# Altium footprint library mastermind.PCBLIB: 1061 footprints (part 6 of 67)
Each footprint in its own frame and in the unit in brackets; x right, y up, seen from the top. Pads: shape width x height; smd on the part's side, far side on the other; paste and mask are expansions set on the pad; w line width, h text height; cw(c..) or ccw(c..) is an arc to the next point about the centre after c.
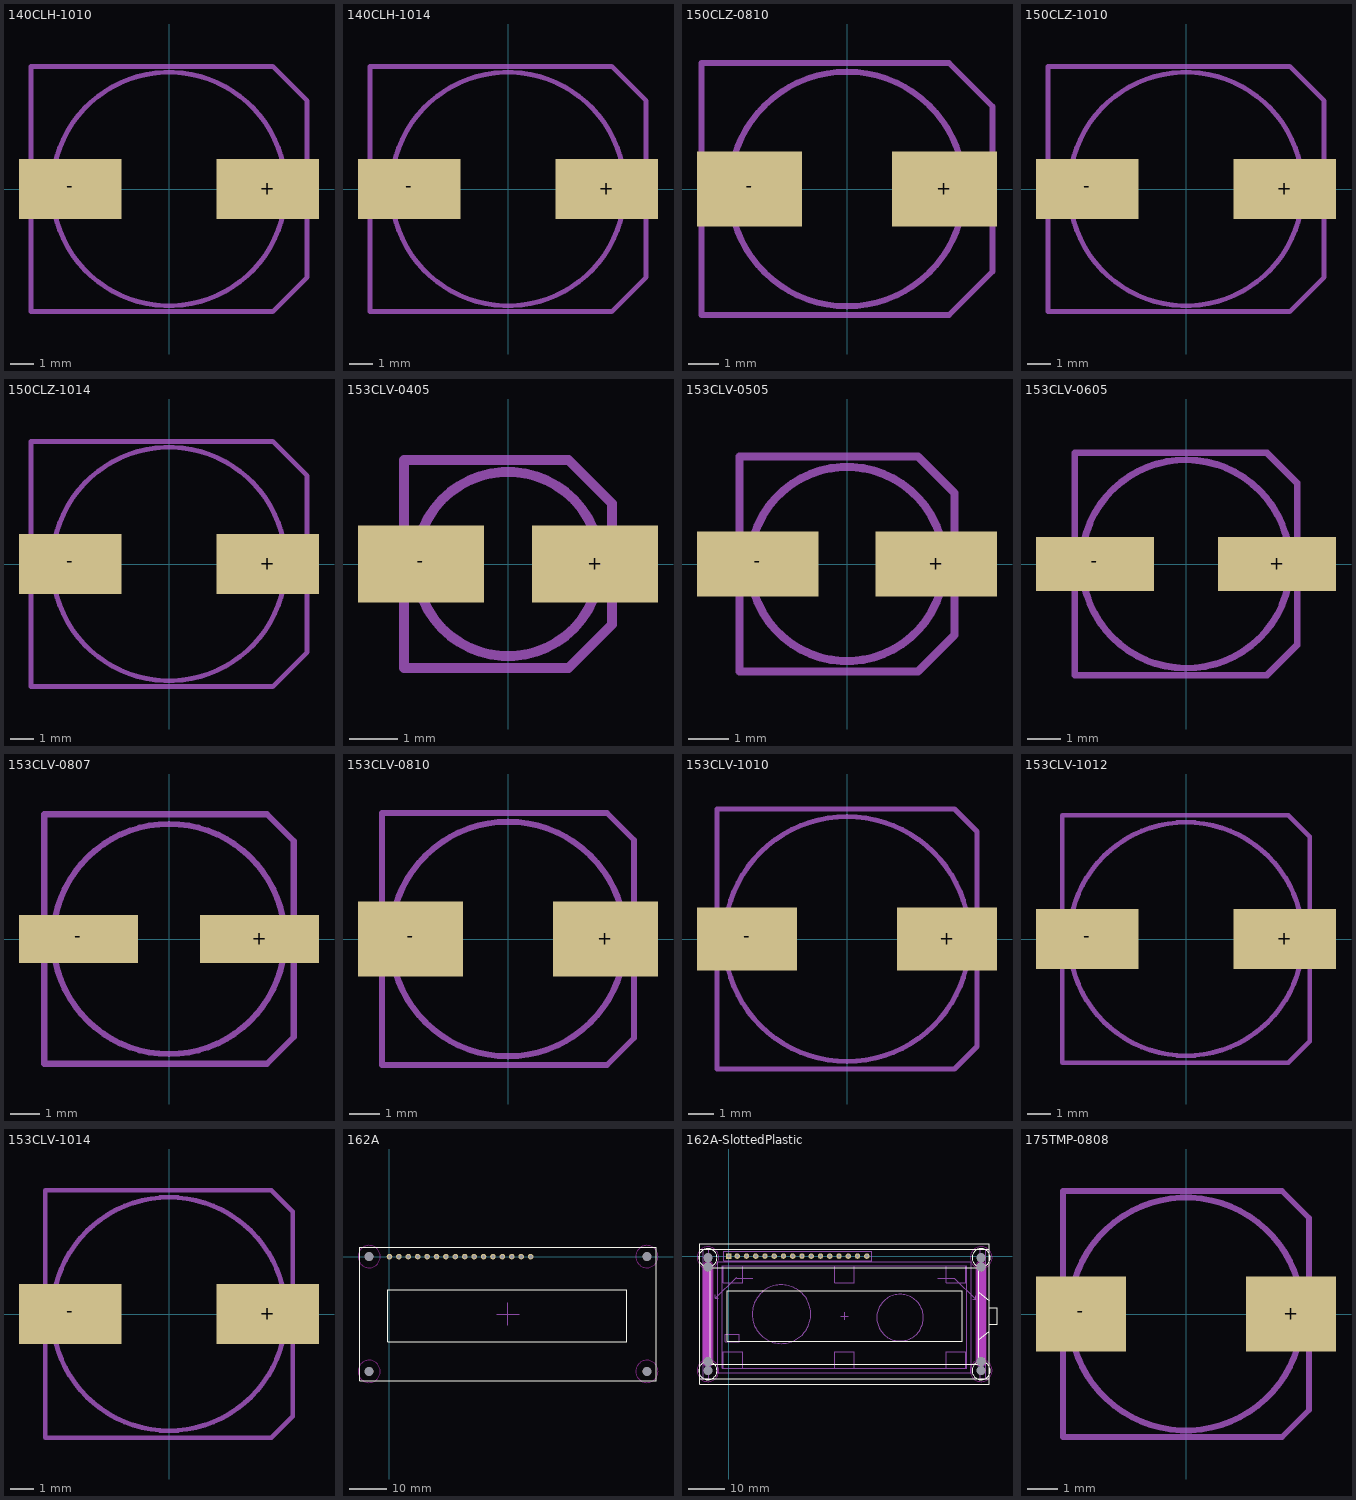
[diagram p5: the footprints below, top view; thin cyan lines are the x and y axes]

## 140CLH-1010 [mm]
pads (2):
  rect 4.3x2.5 smd: +(4.15,0) -(-4.15,0)
Mechanical 2:
  lines w0.203: -5.8,-1.45 -5.8,-5.15 4.35,-5.15 5.8,-3.7 5.8,-1.45 ; -5.8,1.45 -5.8,5.15 4.35,5.15 5.8,3.7 5.8,1.45 ; -4.7,-1.4 ccw(c0,0) 4.7,-1.4 ; -4.7,1.4 cw(c0,0) 4.7,1.4
Mechanical 8:
  lines w0.203: -5.8,-1.45 -5.8,1.45 ; -4.7,-1.4 cw(c0,0) -4.7,1.4 ; 4.7,-1.4 ccw(c0,0) 4.7,1.4 ; 5.8,-1.45 5.8,1.45

## 140CLH-1014 [mm]
pads (2):
  rect 4.3x2.5 smd: +(4.15,0) -(-4.15,0)
Mechanical 2:
  lines w0.203: -5.8,-1.45 -5.8,-5.15 4.35,-5.15 5.8,-3.7 5.8,-1.45 ; -5.8,1.45 -5.8,5.15 4.35,5.15 5.8,3.7 5.8,1.45 ; -4.7,-1.4 ccw(c0,0) 4.7,-1.4 ; -4.7,1.4 cw(c0,0) 4.7,1.4
Mechanical 8:
  lines w0.203: -5.8,-1.45 -5.8,1.45 ; -4.7,-1.4 cw(c0,0) -4.7,1.4 ; 4.7,-1.4 ccw(c0,0) 4.7,1.4 ; 5.8,-1.45 5.8,1.45

## 150CLZ-0810 [mm]
pads (2):
  rect 3.5x2.5 smd: +(3.25,0) -(-3.25,0)
Mechanical 2:
  lines w0.203: -4.85,-1.45 -4.85,-4.2 3.4,-4.2 4.85,-2.75 4.85,-1.45 ; -4.85,1.45 -4.85,4.2 3.4,4.2 4.85,2.75 4.85,1.45 ; -3.65,-1.4 ccw(c0,0) 3.65,-1.4 ; -3.65,1.4 cw(c0,0) 3.65,1.4
Mechanical 8:
  lines w0.203: -4.85,-1.45 -4.85,1.45 ; -3.65,-1.4 cw(c0,0) -3.65,1.4 ; 3.65,-1.4 ccw(c0,0) 3.65,1.4 ; 4.85,-1.45 4.85,1.45

## 150CLZ-1010 [mm]
pads (2):
  rect 4.3x2.5 smd: +(4.15,0) -(-4.15,0)
Mechanical 2:
  lines w0.203: -5.8,-1.45 -5.8,-5.15 4.35,-5.15 5.8,-3.7 5.8,-1.45 ; -5.8,1.45 -5.8,5.15 4.35,5.15 5.8,3.7 5.8,1.45 ; -4.7,-1.4 ccw(c0,0) 4.7,-1.4 ; -4.7,1.4 cw(c0,0) 4.7,1.4
Mechanical 8:
  lines w0.203: -5.8,-1.45 -5.8,1.45 ; -4.7,-1.4 cw(c0,0) -4.7,1.4 ; 4.7,-1.4 ccw(c0,0) 4.7,1.4 ; 5.8,-1.45 5.8,1.45

## 150CLZ-1014 [mm]
pads (2):
  rect 4.3x2.5 smd: +(4.15,0) -(-4.15,0)
Mechanical 2:
  lines w0.203: -5.8,-1.45 -5.8,-5.15 4.35,-5.15 5.8,-3.7 5.8,-1.45 ; -5.8,1.45 -5.8,5.15 4.35,5.15 5.8,3.7 5.8,1.45 ; -4.7,-1.4 ccw(c0,0) 4.7,-1.4 ; -4.7,1.4 cw(c0,0) 4.7,1.4
Mechanical 8:
  lines w0.203: -5.8,-1.45 -5.8,1.45 ; -4.7,-1.4 cw(c0,0) -4.7,1.4 ; 4.7,-1.4 ccw(c0,0) 4.7,1.4 ; 5.8,-1.45 5.8,1.45

## 153CLV-0405 [mm]
pads (2):
  rect 2.6x1.6 smd: +(1.8,0) -(-1.8,0)
Mechanical 2:
  lines w0.203: -2.15,-1.1 -2.15,-2.15 1.25,-2.15 2.15,-1.25 2.15,-1.05 ; -2.15,1.1 -2.15,2.15 1.25,2.15 2.15,1.25 2.15,1.1 ; -1.65,-0.95 ccw(c0,0) 1.65,-0.95 ; -1.65,0.95 cw(c0,0) 1.65,0.95
Mechanical 8:
  lines w0.203: -2.15,-1.1 -2.15,1.1 ; -1.65,-0.95 cw(c0,0) -1.65,0.95 ; 1.65,-0.95 ccw(c0,0) 1.65,0.95 ; 2.15,-1.05 2.15,1.1

## 153CLV-0505 [mm]
pads (2):
  rect 3x1.6 smd: +(2.2,0) -(-2.2,0)
Mechanical 2:
  lines w0.203: -2.65,-1.1 -2.65,-2.65 1.75,-2.65 2.65,-1.75 2.65,-1.1 ; -2.65,1.1 -2.65,2.65 1.75,2.65 2.65,1.75 2.65,1.1 ; -2.2,-0.95 ccw(c0,0) 2.2,-0.95 ; -2.2,0.95 cw(c0,0) 2.2,0.95
Mechanical 8:
  lines w0.203: -2.65,-1.1 -2.65,1.1 ; -2.2,-0.95 cw(c0,0) -2.2,0.95 ; 2.2,-0.95 ccw(c0,0) 2.2,0.95 ; 2.65,-1.1 2.65,1.1

## 153CLV-0605 [mm]
pads (2):
  rect 3.5x1.6 smd: +(2.7,0) -(-2.7,0)
Mechanical 2:
  lines w0.203: -3.3,-1.1 -3.3,-3.3 2.4,-3.3 3.3,-2.4 3.3,-1.1 ; -3.3,1.1 -3.3,3.3 2.4,3.3 3.3,2.4 3.3,1.1 ; -2.95,-0.9 ccw(c0.008,0) 2.95,-0.95 ; -2.95,0.95 cw(c-0.008,0) 2.95,0.9
Mechanical 8:
  lines w0.203: -3.3,-1.1 -3.3,1.1 ; -2.95,-0.9 cw(c0,0.025) -2.95,0.95 ; 2.95,-0.95 ccw(c0,-0.025) 2.95,0.9 ; 3.3,-1.1 3.3,1.1

## 153CLV-0807 [mm]
pads (2):
  rect 4x1.6 smd: +(3.05,0) -(-3.05,0)
Mechanical 2:
  lines w0.203: -4.2,-1.1 -4.2,-4.2 3.3,-4.2 4.2,-3.3 4.2,-1.1 ; -4.2,1.1 -4.2,4.2 3.3,4.2 4.2,3.3 4.2,1.1 ; -3.75,-1.05 ccw(c0,0.025) 3.75,-1.05 ; -3.75,1.05 cw(c0,-0.025) 3.75,1.05
Mechanical 8:
  lines w0.203: -4.2,-1.1 -4.2,1.1 ; -3.75,-1.05 cw(c0,0) -3.75,1.05 ; 3.75,-1.05 ccw(c0,0) 3.75,1.05 ; 4.2,-1.1 4.2,1.1

## 153CLV-0810 [mm]
pads (2):
  rect 3.5x2.5 smd: +(3.25,0) -(-3.25,0)
Mechanical 2:
  lines w0.203: -4.2,-1.5 -4.2,-4.2 3.3,-4.2 4.2,-3.3 4.2,-1.5 ; -4.2,1.5 -4.2,4.2 3.3,4.2 4.2,3.3 4.2,1.5 ; -3.65,-1.4 ccw(c0,0) 3.65,-1.4 ; -3.65,1.4 cw(c0,0) 3.65,1.4
Mechanical 8:
  lines w0.203: -4.2,-1.5 -4.2,1.5 ; -3.65,-1.4 cw(c0,0) -3.65,1.4 ; 3.65,-1.4 ccw(c0,0) 3.65,1.4 ; 4.2,-1.5 4.2,1.5

## 153CLV-1010 [mm]
pads (2):
  rect 4x2.5 smd: +(4,0) -(-4,0)
Mechanical 2:
  lines w0.203: -5.2,-1.5 -5.2,-5.2 4.3,-5.2 5.2,-4.3 5.2,-1.5 ; -5.2,1.5 -5.2,5.2 4.3,5.2 5.2,4.3 5.2,1.5 ; -4.65,-1.55 ccw(c0,0) 4.65,-1.55 ; -4.65,1.55 cw(c0,0) 4.65,1.55
Mechanical 8:
  lines w0.203: -5.2,-1.5 -5.2,1.5 ; -4.65,-1.55 cw(c0,0) -4.65,1.55 ; 4.65,-1.55 ccw(c0,0) 4.65,1.55 ; 5.2,-1.5 5.2,1.5

## 153CLV-1012 [mm]
pads (2):
  rect 4.3x2.5 smd: +(4.15,0) -(-4.15,0)
Mechanical 2:
  lines w0.203: -5.2,-1.5 -5.2,-5.2 4.3,-5.2 5.2,-4.3 5.2,-1.5 ; -5.2,1.5 -5.2,5.2 4.3,5.2 5.2,4.3 5.2,1.5 ; -4.65,-1.55 ccw(c0,0) 4.65,-1.55 ; -4.65,1.55 cw(c0,0) 4.65,1.55
Mechanical 8:
  lines w0.203: -5.2,-1.5 -5.2,1.5 ; -4.65,-1.55 cw(c0,0) -4.65,1.55 ; 4.65,-1.55 ccw(c0,0) 4.65,1.55 ; 5.2,-1.5 5.2,1.5

## 153CLV-1014 [mm]
pads (2):
  rect 4.3x2.5 smd: +(4.15,0) -(-4.15,0)
Mechanical 2:
  lines w0.203: -5.2,-1.5 -5.2,-5.2 4.3,-5.2 5.2,-4.3 5.2,-1.5 ; -5.2,1.5 -5.2,5.2 4.3,5.2 5.2,4.3 5.2,1.5 ; -4.65,-1.55 ccw(c0,0) 4.65,-1.55 ; -4.65,1.55 cw(c0,0) 4.65,1.55
Mechanical 8:
  lines w0.203: -5.2,-1.5 -5.2,1.5 ; -4.65,-1.55 cw(c0,0) -4.65,1.55 ; 4.65,-1.55 ccw(c0,0) 4.65,1.55 ; 5.2,-1.5 5.2,1.5

## 162A [mm]
pads (20):
  round 1.5 hole 0.9: 1(0,0) 2(2.54,0) 3(5.08,0) 4(7.62,0) 5(10.16,0) 6(12.7,0) 7(15.24,0) 8(17.78,0) 9(20.32,0) 10(22.86,0) 11(25.4,0) 12(27.94,0) 13(30.48,0) 14(33.02,0) 15(35.56,0) 16(38.1,0)
  round 2.3 hole 2.5 unplated: M1(-5.5,0) M2(69.5,0) M3(-5.5,-31) M4(69.5,-31)
Top Overlay:
  lines w0.2: -8,-33.5 72,-33.5 72,2.5 -8,2.5 -8,-33.5 ; -0.5,-23 64,-23 64,-9 -0.5,-9 -0.5,-23
Keep-Out Layer:
  circle w0.2: c69.5,0 r3
  circle w0.2: c69.5,-31 r3
  circle w0.2: c-5.5,-31 r3
  circle w0.2: c-5.5,0 r3
Mechanical 15:
  lines w0.254: 29,-15.5 35,-15.5 ; 32,-18.5 32,-12.5
3D body: height 8.89, standoff 4.83, extent -0.5,-23 64,-9
3D body: height 10.16, standoff 4.83, extent 30.5,-27.5 66,-3
3D body: height 10.16, standoff 4.83, extent -2.5,-27.5 33,-3
3D body: height 4.06, standoff 0, extent 67.248,-2.252 71.752,2.252
3D body: height 4.06, standoff 0, extent 67.248,-33.252 71.752,-28.748
3D body: height 4.06, standoff 0, extent -7.752,-33.252 -3.248,-28.748
3D body: height 4.06, standoff 0, extent -7.752,-2.252 -3.248,2.252
3D body: height 4.83, standoff 4.06, extent -8.012,-33.5 72,2.5

## 162A-SlottedPlastic [mm] "LCD and Mounting Moulding"
height 18.58
pads (25):
  rect 1.5x1.5 / inner rect 1.5x1.5 / far side rect 1.7x1.7 hole 0.9: 1(0,0)
  round 1.5 / inner round 1.5 / far side round 1.7 hole 0.9: 2(2.29,0) 3(4.83,0) 4(7.37,0) 5(9.91,0) 6(12.45,0) 7(14.99,0) 8(17.53,0) 9(20.07,0) 10(22.61,0) 11(25.15,0) 12(27.69,0) 13(30.23,0) 14(32.77,0) 15(35.31,0) 16(37.85,0)
  round 2.3 hole 2.5 unplated: M1(-5.75,-0.45) M2(69.25,-0.45) M2(69.25,-0.45) M3(-5.75,-31.45) M4(69.25,-31.45)
  round 2.4 hole 2.5 unplated: S1_1(-5.75,-3) S1_2(-5.75,-28.9) S2_1(69.25,-3) S2_2(69.25,-28.9)
Top Overlay:
  circle w0.2: c-5.75,-0.45 r2.5
  circle w0.2: c69.25,-0.45 r2.5
  circle w0.2: c69.25,-31.45 r2.5
  circle w0.2: c-5.75,-31.45 r2.5
  lines w0.2: 68.55,-22.95 71.5,-20.65 ; 68.55,-9.95 71.5,-12.25 ; 71.5,-18.75 73.6,-18.75 73.6,-14.15 71.5,-14.15 ; -8,-33.65 -8,1.85 ; -8,-33.65 71.5,-33.65 ; -8,-33.65 -8,-35.2 71.5,-35.2 71.5,-33.65 ; -8,1.85 71.5,1.85 ; -8,1.85 -8,3.4 71.5,3.4 71.5,1.85 ; 71.5,-33.65 71.5,1.85 ; -5.05,-29.75 68.55,-29.75 68.55,-3.15 -5.05,-3.15 -5.05,-29.75 ; -0.5,-23.35 -0.5,-9.55 64,-9.55 64,-23.35 -0.5,-23.35
Bottom Overlay:
  circle w0.2: c-5.75,-0.45 r2.5
  circle w0.2: c69.25,-0.45 r2.5
  circle w0.2: c69.25,-31.45 r2.5
  circle w0.2: c-5.75,-31.45 r2.5
Keep-Out Layer:
  circle w0.2: c-5.75,-0.45 r3
  circle w0.2: c-5.75,-31.45 r3
  circle w0.2: c69.25,-31.45 r3
  circle w0.2: c69.25,-0.45 r3
  lines w3: -5.75,-29.15 -5.75,-2.75 ; 69.25,-29.15 69.25,-2.75
Mechanical 1:
  lines w0.2: 30.75,-16.45 32.75,-16.45 ; 31.75,-17.45 31.75,-15.45
Mechanical 3:
  lines w0.2: -3.7,-10.65 -3.7,-11.55 ; -2.9,-11.55 -3.7,-11.55 ; 2.1,-6.05 6.6,-6.05 ; 2.1,-5.75 -3.7,-11.55 ; 57.3,-6.05 61.9,-6.05 67.7,-11.85 ; 66.9,-11.85 67.7,-11.85 ; 67.7,-10.95 67.7,-11.85
  lines w2.5: -5.75,-28.9 -5.75,-3 ; 69.25,-28.9 69.25,-3
  text "Two non-plated slots 2.5mm wide from hole to hole" at 8.3,-6.35 h1
Mechanical 4:
  circle w0.1: c47,-16.9 r6.4
  circle w0.1: c14.45,-15.95 r8.05
  lines w0.1: -7,-33.65 -5.5,-33.65 -5.5,1.85 -7,1.85 -7,-33.65 ; -3,-32 -3,-1.5 66.5,-1.5 66.5,-32 -3,-32 ; -1.8,-30.8 65.3,-30.8 65.3,-2.7 -1.8,-2.7 -1.8,-30.8 ; -1.55,-30.8 -1.55,-26.2 3.85,-26.2 3.85,-30.8 -1.55,-30.8 ; -1.55,-7.3 -1.55,-2.7 3.85,-2.7 3.85,-7.3 -1.55,-7.3 ; -1.4,-1.3 39.2,-1.3 39.2,1.3 -1.4,1.3 -1.4,-1.3 ; -1,-23.5 2.9,-23.5 2.9,-21.4 -1,-21.4 -1,-23.5 ; 29.05,-30.8 29.05,-26.2 34.45,-26.2 34.45,-30.8 29.05,-30.8 ; 29.05,-7.3 34.45,-7.3 34.45,-2.7 29.05,-2.7 29.05,-7.3 ; 59.65,-30.8 59.65,-26.2 65.05,-26.2 65.05,-30.8 59.65,-30.8 ; 59.65,-7.3 59.65,-2.7 65.05,-2.7 65.05,-7.3 59.65,-7.3 ; 69,-33.65 69,1.85 70.5,1.85 70.5,-33.65 69,-33.65
3D body: height 18.9, standoff 10.6, extent -5.05,-29.75 68.55,-3.15
3D body: height 13, standoff 9, extent -8,1.85 1.65,3.4
3D body: height 13, standoff 9, extent -8,-35.2 1.65,-33.65
3D body: height 13, standoff 9, extent 62.75,-35.2 72.4,-33.65
3D body: height 13, standoff 9, extent 61.85,1.85 71.5,3.4
3D body: height 10.7, standoff 9, extent 1.65,1.85 61.85,3.4
3D body: height 10.7, standoff 9, extent 1.65,-35.2 61.85,-33.65
3D body: height 18.95, standoff 18.9, extent -5.05,-29.75 31.75,-3.15
3D body: height 18.95, standoff 18.9, extent 31.75,-29.75 68.55,-3.15
3D body: height 13.3, standoff 7.3, extent 71.501,-18.749 73.599,-14.151
3D body: height 10.6, standoff 9, extent -8,-33.65 71.5,1.85
3D body: height 14.1, standoff 10.6, extent 68.55,-22.95 71.5,-9.95
3D body: height 9, standoff 6.7, extent -3,-35.2 66.5,-32
3D body: height 9, standoff 0, extent 69,-33.65 70.5,1.85
3D body: height 9, standoff 0, extent -7,-33.65 -5.5,1.85
3D body: height 9, standoff 0, extent -1.4,-1.3 39.2,1.3
3D body: height 9, standoff 8.3, extent -1,-23.5 2.9,-21.4
3D body: height 9, standoff 5.3, extent 65.3,-30.8 66.5,-2.7
3D body: height 9, standoff 5.3, extent -3,-30.8 -1.8,-2.7
3D body: height 9, standoff 5.3, extent -3,-32 66.5,-30.75
3D body: height 9, standoff 5.3, extent -3,-2.7 66.5,-1.5
3D body: height 9, standoff 7, extent 29.05,-30.8 34.45,-26.2
3D body: height 9, standoff 7, extent -1.55,-30.8 3.85,-26.2
3D body: height 9, standoff 7, extent -1.55,-7.3 3.85,-2.7
3D body: height 9, standoff 7, extent 59.65,-7.3 65.05,-2.7
3D body: height 9, standoff 7, extent 59.65,-30.8 65.05,-26.2
3D body: height 9, standoff 8, extent 6.399,-24.001 22.501,-7.899
3D body: height 9, standoff 6.7, extent -8,-35.2 -3,3.4
3D body: height 9, standoff 6.7, extent -3,-1.5 66.5,3.4
3D body: height 9, standoff 6.7, extent -1.4,-1.5 39.2,-1.3
3D body: height 9, standoff 6.7, extent 66.5,-35.2 71.5,3.4
3D body: height 9, standoff 7, extent 29.05,-7.3 34.45,-2.7
3D body: height 9, standoff 8, extent 40.599,-23.301 53.401,-10.499

## 175TMP-0808 [mm]
pads (2):
  rect 3x2.5 smd: +(3.5,0) -(-3.5,0)
Mechanical 2:
  lines w0.203: -4.1,-1.55 -4.1,-4.1 3.2,-4.1 4.1,-3.2 4.1,-1.55 ; -4.1,1.55 -4.1,4.1 3.2,4.1 4.1,3.2 4.1,1.5 ; -3.6,-1.45 ccw(c0,0) 3.6,-1.45 ; -3.6,1.45 cw(c0,0) 3.6,1.45
Mechanical 8:
  lines w0.203: -4.1,-1.55 -4.1,1.55 ; -3.6,-1.45 cw(c0,0) -3.6,1.45 ; 3.6,-1.45 ccw(c0,0) 3.6,1.45 ; 4.1,-1.55 4.1,1.5